# Altium footprint library con-samtec.PCBLIB: 805 footprints (part 44 of 55)
Each footprint in its own frame and in the unit in brackets; x right, y up, seen from the top. Pads: shape width x height; smd on the part's side, far side on the other; paste and mask are expansions set on the pad; w line width, h text height; cw(c..) or ccw(c..) is an arc to the next point about the centre after c.
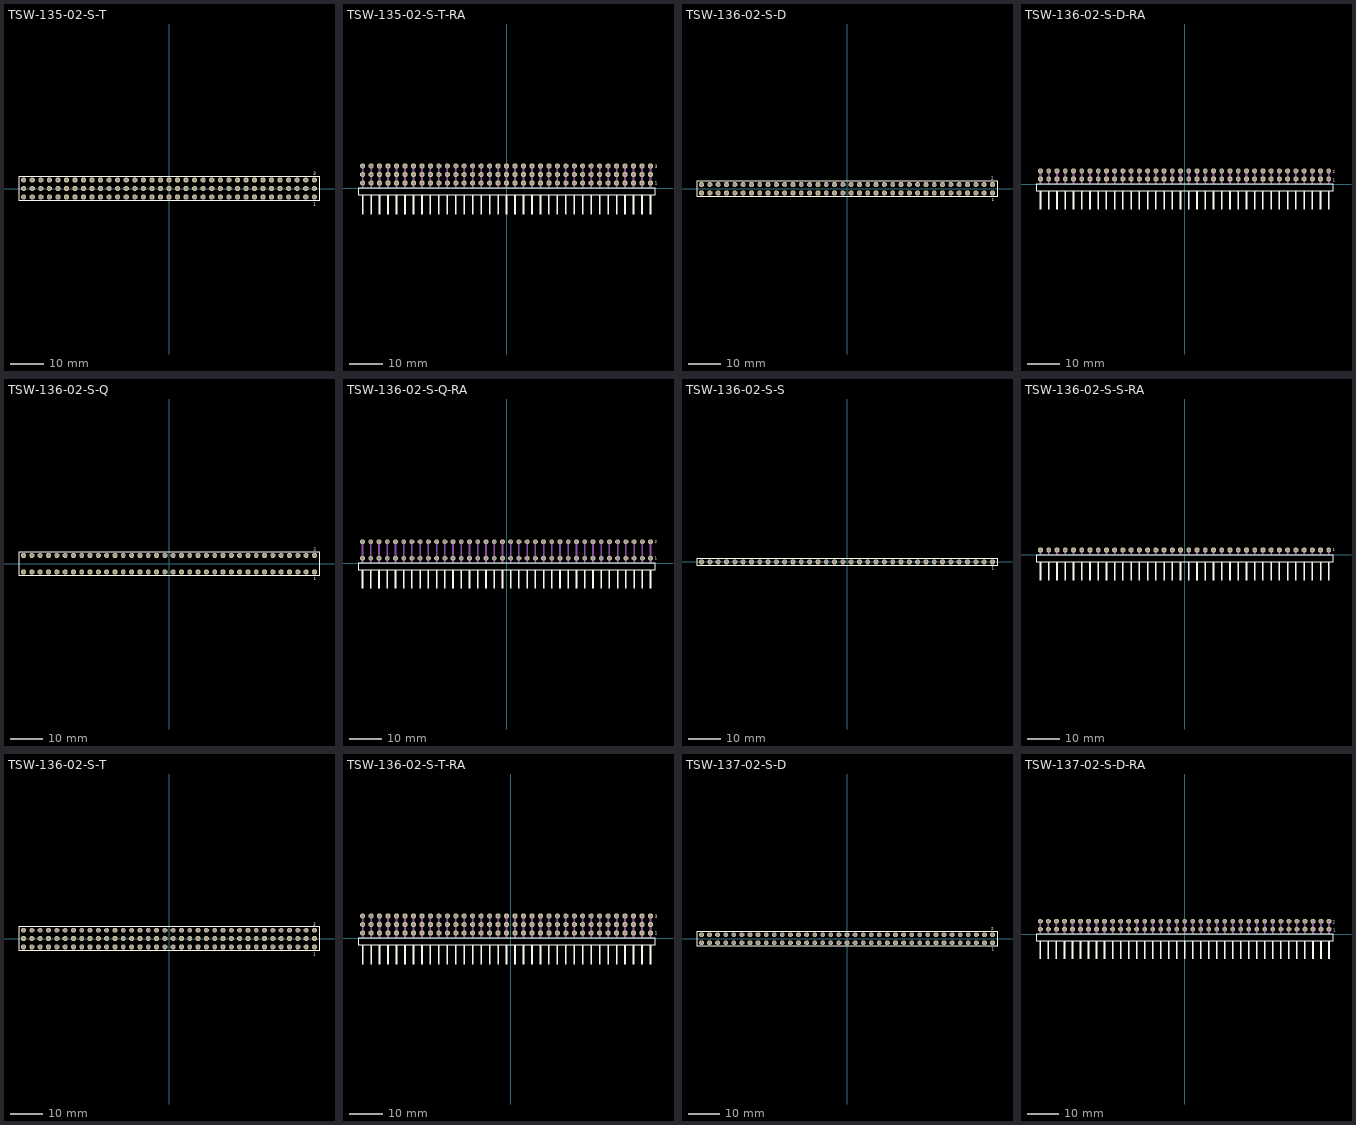
[diagram p43: the footprints below, top view; thin cyan lines are the x and y axes]

## TSW-135-02-S-T [mm]
pads (105):
  oct 1.5x1.5 hole 1: 1(43.18,-2.54) 2(43.18,0) 3(43.18,2.54) 4(40.64,-2.54) 5(40.64,0) 6(40.64,2.54) 7(38.1,-2.54) 8(38.1,0) 9(38.1,2.54) 10(35.56,-2.54) 11(35.56,0) 12(35.56,2.54) 13(33.02,-2.54) 14(33.02,0) 15(33.02,2.54) 16(30.48,-2.54) 17(30.48,0) 18(30.48,2.54) 19(27.94,-2.54) 20(27.94,0) 21(27.94,2.54) 22(25.4,-2.54) 23(25.4,0) 24(25.4,2.54) 25(22.86,-2.54) 26(22.86,0) 27(22.86,2.54) 28(20.32,-2.54) 29(20.32,0) 30(20.32,2.54) 31(17.78,-2.54) 32(17.78,0) 33(17.78,2.54) 34(15.24,-2.54) 35(15.24,0) 36(15.24,2.54) 37(12.7,-2.54) 38(12.7,0) 39(12.7,2.54) 40(10.16,-2.54) 41(10.16,0) 42(10.16,2.54) 43(7.62,-2.54) 44(7.62,0) 45(7.62,2.54) 46(5.08,-2.54) 47(5.08,0) 48(5.08,2.54) 49(2.54,-2.54) 50(2.54,0) 51(2.54,2.54) 52(0,-2.54) 53(0,0) 54(0,2.54) 55(-2.54,-2.54) 56(-2.54,0) 57(-2.54,2.54) 58(-5.08,-2.54) 59(-5.08,0) 60(-5.08,2.54) 61(-7.62,-2.54) 62(-7.62,0) 63(-7.62,2.54) 64(-10.16,-2.54) 65(-10.16,0) 66(-10.16,2.54) 67(-12.7,-2.54) 68(-12.7,0) 69(-12.7,2.54) 70(-15.24,-2.54) 71(-15.24,0) 72(-15.24,2.54) 73(-17.78,-2.54) 74(-17.78,0) 75(-17.78,2.54) 76(-20.32,-2.54) 77(-20.32,0) 78(-20.32,2.54) 79(-22.86,-2.54) 80(-22.86,0) 81(-22.86,2.54) 82(-25.4,-2.54) 83(-25.4,0) 84(-25.4,2.54) 85(-27.94,-2.54) 86(-27.94,0) 87(-27.94,2.54) 88(-30.48,-2.54) 89(-30.48,0) 90(-30.48,2.54) 91(-33.02,-2.54) 92(-33.02,0) 93(-33.02,2.54) 94(-35.56,-2.54) 95(-35.56,0) 96(-35.56,2.54) 97(-38.1,-2.54) 98(-38.1,0) 99(-38.1,2.54) 100(-40.64,-2.54) 101(-40.64,0) 102(-40.64,2.54) 103(-43.18,-2.54) 104(-43.18,0) 105(-43.18,2.54)
Top Overlay:
  lines w0.203: -44.579,-3.695 44.579,-3.695 44.579,3.695 -44.579,3.695 -44.579,-3.695
  text "1" at 42.872,-5.188 h0.94
  text "3" at 42.868,3.989 h0.94
Mechanical 16:
  rectangle: -43.53,-2.89 -42.83,-2.19
  rectangle: -43.53,-0.35 -42.83,0.35
  rectangle: -43.53,2.19 -42.83,2.89
  rectangle: -40.99,-2.89 -40.29,-2.19
  rectangle: -40.99,-0.35 -40.29,0.35
  rectangle: -40.99,2.19 -40.29,2.89
  rectangle: -38.45,-2.89 -37.75,-2.19
  rectangle: -38.45,-0.35 -37.75,0.35
  rectangle: -38.45,2.19 -37.75,2.89
  rectangle: -35.91,-2.89 -35.21,-2.19
  rectangle: -35.91,-0.35 -35.21,0.35
  rectangle: -35.91,2.19 -35.21,2.89
  rectangle: -33.37,-2.89 -32.67,-2.19
  rectangle: -33.37,-0.35 -32.67,0.35
  rectangle: -33.37,2.19 -32.67,2.89
  rectangle: -30.83,-2.89 -30.13,-2.19
  rectangle: -30.83,-0.35 -30.13,0.35
  rectangle: -30.83,2.19 -30.13,2.89
  rectangle: -28.29,-2.89 -27.59,-2.19
  rectangle: -28.29,-0.35 -27.59,0.35
  rectangle: -28.29,2.19 -27.59,2.89
  rectangle: -25.75,-2.89 -25.05,-2.19
  rectangle: -25.75,-0.35 -25.05,0.35
  rectangle: -25.75,2.19 -25.05,2.89
  rectangle: -23.21,-2.89 -22.51,-2.19
  rectangle: -23.21,-0.35 -22.51,0.35
  rectangle: -23.21,2.19 -22.51,2.89
  rectangle: -20.67,-2.89 -19.97,-2.19
  rectangle: -20.67,-0.35 -19.97,0.35
  rectangle: -20.67,2.19 -19.97,2.89
  rectangle: -18.13,-2.89 -17.43,-2.19
  rectangle: -18.13,-0.35 -17.43,0.35
  rectangle: -18.13,2.19 -17.43,2.89
  rectangle: -15.59,-2.89 -14.89,-2.19
  rectangle: -15.59,-0.35 -14.89,0.35
  rectangle: -15.59,2.19 -14.89,2.89
  rectangle: -13.05,-2.89 -12.35,-2.19
  rectangle: -13.05,-0.35 -12.35,0.35
  rectangle: -13.05,2.19 -12.35,2.89
  rectangle: -10.51,-2.89 -9.81,-2.19
  rectangle: -10.51,-0.35 -9.81,0.35
  rectangle: -10.51,2.19 -9.81,2.89
  rectangle: -7.97,-2.89 -7.27,-2.19
  rectangle: -7.97,-0.35 -7.27,0.35
  rectangle: -7.97,2.19 -7.27,2.89
  rectangle: -5.43,-2.89 -4.73,-2.19
  rectangle: -5.43,-0.35 -4.73,0.35
  rectangle: -5.43,2.19 -4.73,2.89
  rectangle: -2.89,-2.89 -2.19,-2.19
  rectangle: -2.89,-0.35 -2.19,0.35
  rectangle: -2.89,2.19 -2.19,2.89
  rectangle: -0.35,-2.89 0.35,-2.19
  rectangle: -0.35,-0.35 0.35,0.35
  rectangle: -0.35,2.19 0.35,2.89
  rectangle: 2.19,-2.89 2.89,-2.19
  rectangle: 2.19,-0.35 2.89,0.35
  rectangle: 2.19,2.19 2.89,2.89
  rectangle: 4.73,-2.89 5.43,-2.19
  rectangle: 4.73,-0.35 5.43,0.35
  rectangle: 4.73,2.19 5.43,2.89
  rectangle: 7.27,-2.89 7.97,-2.19
  rectangle: 7.27,-0.35 7.97,0.35
  rectangle: 7.27,2.19 7.97,2.89
  rectangle: 9.81,-2.89 10.51,-2.19
  rectangle: 9.81,-0.35 10.51,0.35
  rectangle: 9.81,2.19 10.51,2.89
  rectangle: 12.35,-2.89 13.05,-2.19
  rectangle: 12.35,-0.35 13.05,0.35
  rectangle: 12.35,2.19 13.05,2.89
  rectangle: 14.89,-2.89 15.59,-2.19
  rectangle: 14.89,-0.35 15.59,0.35
  rectangle: 14.89,2.19 15.59,2.89
  rectangle: 17.43,-2.89 18.13,-2.19
  rectangle: 17.43,-0.35 18.13,0.35
  rectangle: 17.43,2.19 18.13,2.89
  rectangle: 19.97,-2.89 20.67,-2.19
  rectangle: 19.97,-0.35 20.67,0.35
  rectangle: 19.97,2.19 20.67,2.89
  rectangle: 22.51,-2.89 23.21,-2.19
  rectangle: 22.51,-0.35 23.21,0.35
  rectangle: 22.51,2.19 23.21,2.89
  rectangle: 25.05,-2.89 25.75,-2.19
  rectangle: 25.05,-0.35 25.75,0.35
  rectangle: 25.05,2.19 25.75,2.89
  rectangle: 27.59,-2.89 28.29,-2.19
  rectangle: 27.59,-0.35 28.29,0.35
  rectangle: 27.59,2.19 28.29,2.89
  rectangle: 30.13,-2.89 30.83,-2.19
  rectangle: 30.13,-0.35 30.83,0.35
  rectangle: 30.13,2.19 30.83,2.89
  rectangle: 32.67,-2.89 33.37,-2.19
  rectangle: 32.67,-0.35 33.37,0.35
  rectangle: 32.67,2.19 33.37,2.89
  rectangle: 35.21,-2.89 35.91,-2.19
  rectangle: 35.21,-0.35 35.91,0.35
  rectangle: 35.21,2.19 35.91,2.89
  rectangle: 37.75,-2.89 38.45,-2.19
  rectangle: 37.75,-0.35 38.45,0.35
  rectangle: 37.75,2.19 38.45,2.89
  rectangle: 40.29,-2.89 40.99,-2.19
  rectangle: 40.29,-0.35 40.99,0.35
  rectangle: 40.29,2.19 40.99,2.89
  rectangle: 42.83,-2.89 43.53,-2.19
  rectangle: 42.83,-0.35 43.53,0.35
  rectangle: 42.83,2.19 43.53,2.89

## TSW-135-02-S-T-RA [mil]
pads (105):
  oct 59.06x59.06 hole 39.37: 1(1700,60) 2(1700,160) 3(1700,260) 4(1600,60) 5(1600,160) 6(1600,260) 7(1500,60) 8(1500,160) 9(1500,260) 10(1400,60) 11(1400,160) 12(1400,260) 13(1300,60) 14(1300,160) 15(1300,260) 16(1200,60) 17(1200,160) 18(1200,260) 19(1100,60) 20(1100,160) 21(1100,260) 22(1000,60) 23(1000,160) 24(1000,260) 25(900,60) 26(900,160) 27(900,260) 28(800,60) 29(800,160) 30(800,260) 31(700,60) 32(700,160) 33(700,260) 34(600,60) 35(600,160) 36(600,260) 37(500,60) 38(500,160) 39(500,260) 40(400,60) 41(400,160) 42(400,260) 43(300,60) 44(300,160) 45(300,260) 46(200,60) 47(200,160) 48(200,260) 49(100,60) 50(100,160) 51(100,260) 52(0,60) 53(0,160) 54(0,260) 55(-100,60) 56(-100,160) 57(-100,260) 58(-200,60) 59(-200,160) 60(-200,260) 61(-300,60) 62(-300,160) 63(-300,260) 64(-400,60) 65(-400,160) 66(-400,260) 67(-500,60) 68(-500,160) 69(-500,260) 70(-600,60) 71(-600,160) 72(-600,260) 73(-700,60) 74(-700,160) 75(-700,260) 76(-800,60) 77(-800,160) 78(-800,260) 79(-900,60) 80(-900,160) 81(-900,260) 82(-1000,60) 83(-1000,160) 84(-1000,260) 85(-1100,60) 86(-1100,160) 87(-1100,260) 88(-1200,60) 89(-1200,160) 90(-1200,260) 91(-1300,60) 92(-1300,160) 93(-1300,260) 94(-1400,60) 95(-1400,160) 96(-1400,260) 97(-1500,60) 98(-1500,160) 99(-1500,260) 100(-1600,60) 101(-1600,160) 102(-1600,260) 103(-1700,60) 104(-1700,160) 105(-1700,260)
Top Overlay:
  rectangle: -1710,-310.63 -1690,-80.32
  rectangle: -1610,-310.63 -1590,-80.32
  rectangle: -1510,-310.63 -1490,-80.32
  rectangle: -1410,-310.63 -1390,-80.32
  rectangle: -1310,-310.63 -1290,-80.32
  rectangle: -1210,-310.63 -1190,-80.32
  rectangle: -1110,-310.63 -1090,-80.32
  rectangle: -1010,-310.63 -990,-80.32
  rectangle: -910,-310.63 -890,-80.32
  rectangle: -810,-310.63 -790,-80.32
  rectangle: -710,-310.63 -690,-80.32
  rectangle: -610,-310.63 -590,-80.32
  rectangle: -510,-310.63 -490,-80.32
  rectangle: -410,-310.63 -390,-80.32
  rectangle: -310,-310.63 -290,-80.32
  rectangle: -210,-310.63 -190,-80.32
  rectangle: -110,-310.63 -90,-80.32
  rectangle: -10,-310.63 10,-80.32
  rectangle: 90,-310.63 110,-80.32
  rectangle: 190,-310.63 210,-80.32
  rectangle: 290,-310.63 310,-80.32
  rectangle: 390,-310.63 410,-80.32
  rectangle: 490,-310.63 510,-80.32
  rectangle: 590,-310.63 610,-80.32
  rectangle: 690,-310.63 710,-80.32
  rectangle: 790,-310.63 810,-80.32
  rectangle: 890,-310.63 910,-80.32
  rectangle: 990,-310.63 1010,-80.32
  rectangle: 1090,-310.63 1110,-80.32
  rectangle: 1190,-310.63 1210,-80.32
  rectangle: 1290,-310.63 1310,-80.32
  rectangle: 1390,-310.63 1410,-80.32
  rectangle: 1490,-310.63 1510,-80.32
  rectangle: 1590,-310.63 1610,-80.32
  rectangle: 1690,-310.63 1710,-80.32
  lines w8: -1755.08,-80.55 1755.08,-80.55 1755.08,-4.17 -1755.08,-4.17 -1755.08,-80.55
  text "1" at 1751.57,41.34 h36.81
  text "3" at 1752.17,236.81 h36.81
Mechanical 16:
  rectangle: -1710,0 -1690,270
  rectangle: -1610,0 -1590,270
  rectangle: -1510,0 -1490,270
  rectangle: -1410,0 -1390,270
  rectangle: -1310,0 -1290,270
  rectangle: -1210,0 -1190,270
  rectangle: -1110,0 -1090,270
  rectangle: -1010,0 -990,270
  rectangle: -910,0 -890,270
  rectangle: -810,0 -790,270
  rectangle: -710,0 -690,270
  rectangle: -610,0 -590,270
  rectangle: -510,0 -490,270
  rectangle: -410,0 -390,270
  rectangle: -310,0 -290,270
  rectangle: -210,0 -190,270
  rectangle: -110,0 -90,270
  rectangle: -10,0 10,270
  rectangle: 90,0 110,270
  rectangle: 190,0 210,270
  rectangle: 290,0 310,270
  rectangle: 390,0 410,270
  rectangle: 490,0 510,270
  rectangle: 590,0 610,270
  rectangle: 690,0 710,270
  rectangle: 790,0 810,270
  rectangle: 890,0 910,270
  rectangle: 990,0 1010,270
  rectangle: 1090,0 1110,270
  rectangle: 1190,0 1210,270
  rectangle: 1290,0 1310,270
  rectangle: 1390,0 1410,270
  rectangle: 1490,0 1510,270
  rectangle: 1590,0 1610,270
  rectangle: 1690,0 1710,270

## TSW-136-02-S-D [mm]
pads (72):
  oct 1.5x1.5 hole 1: 1(44.45,-1.27) 2(44.45,1.27) 3(41.91,-1.27) 4(41.91,1.27) 5(39.37,-1.27) 6(39.37,1.27) 7(36.83,-1.27) 8(36.83,1.27) 9(34.29,-1.27) 10(34.29,1.27) 11(31.75,-1.27) 12(31.75,1.27) 13(29.21,-1.27) 14(29.21,1.27) 15(26.67,-1.27) 16(26.67,1.27) 17(24.13,-1.27) 18(24.13,1.27) 19(21.59,-1.27) 20(21.59,1.27) 21(19.05,-1.27) 22(19.05,1.27) 23(16.51,-1.27) 24(16.51,1.27) 25(13.97,-1.27) 26(13.97,1.27) 27(11.43,-1.27) 28(11.43,1.27) 29(8.89,-1.27) 30(8.89,1.27) 31(6.35,-1.27) 32(6.35,1.27) 33(3.81,-1.27) 34(3.81,1.27) 35(1.27,-1.27) 36(1.27,1.27) 37(-1.27,-1.27) 38(-1.27,1.27) 39(-3.81,-1.27) 40(-3.81,1.27) 41(-6.35,-1.27) 42(-6.35,1.27) 43(-8.89,-1.27) 44(-8.89,1.27) 45(-11.43,-1.27) 46(-11.43,1.27) 47(-13.97,-1.27) 48(-13.97,1.27) 49(-16.51,-1.27) 50(-16.51,1.27) 51(-19.05,-1.27) 52(-19.05,1.27) 53(-21.59,-1.27) 54(-21.59,1.27) 55(-24.13,-1.27) 56(-24.13,1.27) 57(-26.67,-1.27) 58(-26.67,1.27) 59(-29.21,-1.27) 60(-29.21,1.27) 61(-31.75,-1.27) 62(-31.75,1.27) 63(-34.29,-1.27) 64(-34.29,1.27) 65(-36.83,-1.27) 66(-36.83,1.27) 67(-39.37,-1.27) 68(-39.37,1.27) 69(-41.91,-1.27) 70(-41.91,1.27) 71(-44.45,-1.27) 72(-44.45,1.27)
Top Overlay:
  lines w0.203: -45.849,-2.425 45.849,-2.425 45.849,2.425 -45.849,2.425 -45.849,-2.425
  text "1" at 44.242,-3.818 h0.94
  text "2" at 44.067,2.744 h0.94
Mechanical 16:
  rectangle: -44.8,-1.62 -44.1,-0.92
  rectangle: -44.8,0.92 -44.1,1.62
  rectangle: -42.26,-1.62 -41.56,-0.92
  rectangle: -42.26,0.92 -41.56,1.62
  rectangle: -39.72,-1.62 -39.02,-0.92
  rectangle: -39.72,0.92 -39.02,1.62
  rectangle: -37.18,-1.62 -36.48,-0.92
  rectangle: -37.18,0.92 -36.48,1.62
  rectangle: -34.64,-1.62 -33.94,-0.92
  rectangle: -34.64,0.92 -33.94,1.62
  rectangle: -32.1,-1.62 -31.4,-0.92
  rectangle: -32.1,0.92 -31.4,1.62
  rectangle: -29.56,-1.62 -28.86,-0.92
  rectangle: -29.56,0.92 -28.86,1.62
  rectangle: -27.02,-1.62 -26.32,-0.92
  rectangle: -27.02,0.92 -26.32,1.62
  rectangle: -24.48,-1.62 -23.78,-0.92
  rectangle: -24.48,0.92 -23.78,1.62
  rectangle: -21.94,-1.62 -21.24,-0.92
  rectangle: -21.94,0.92 -21.24,1.62
  rectangle: -19.4,-1.62 -18.7,-0.92
  rectangle: -19.4,0.92 -18.7,1.62
  rectangle: -16.86,-1.62 -16.16,-0.92
  rectangle: -16.86,0.92 -16.16,1.62
  rectangle: -14.32,-1.62 -13.62,-0.92
  rectangle: -14.32,0.92 -13.62,1.62
  rectangle: -11.78,-1.62 -11.08,-0.92
  rectangle: -11.78,0.92 -11.08,1.62
  rectangle: -9.24,-1.62 -8.54,-0.92
  rectangle: -9.24,0.92 -8.54,1.62
  rectangle: -6.7,-1.62 -6,-0.92
  rectangle: -6.7,0.92 -6,1.62
  rectangle: -4.16,-1.62 -3.46,-0.92
  rectangle: -4.16,0.92 -3.46,1.62
  rectangle: -1.62,-1.62 -0.92,-0.92
  rectangle: -1.62,0.92 -0.92,1.62
  rectangle: 0.92,-1.62 1.62,-0.92
  rectangle: 0.92,0.92 1.62,1.62
  rectangle: 3.46,-1.62 4.16,-0.92
  rectangle: 3.46,0.92 4.16,1.62
  rectangle: 6,-1.62 6.7,-0.92
  rectangle: 6,0.92 6.7,1.62
  rectangle: 8.54,-1.62 9.24,-0.92
  rectangle: 8.54,0.92 9.24,1.62
  rectangle: 11.08,-1.62 11.78,-0.92
  rectangle: 11.08,0.92 11.78,1.62
  rectangle: 13.62,-1.62 14.32,-0.92
  rectangle: 13.62,0.92 14.32,1.62
  rectangle: 16.16,-1.62 16.86,-0.92
  rectangle: 16.16,0.92 16.86,1.62
  rectangle: 18.7,-1.62 19.4,-0.92
  rectangle: 18.7,0.92 19.4,1.62
  rectangle: 21.24,-1.62 21.94,-0.92
  rectangle: 21.24,0.92 21.94,1.62
  rectangle: 23.78,-1.62 24.48,-0.92
  rectangle: 23.78,0.92 24.48,1.62
  rectangle: 26.32,-1.62 27.02,-0.92
  rectangle: 26.32,0.92 27.02,1.62
  rectangle: 28.86,-1.62 29.56,-0.92
  rectangle: 28.86,0.92 29.56,1.62
  rectangle: 31.4,-1.62 32.1,-0.92
  rectangle: 31.4,0.92 32.1,1.62
  rectangle: 33.94,-1.62 34.64,-0.92
  rectangle: 33.94,0.92 34.64,1.62
  rectangle: 36.48,-1.62 37.18,-0.92
  rectangle: 36.48,0.92 37.18,1.62
  rectangle: 39.02,-1.62 39.72,-0.92
  rectangle: 39.02,0.92 39.72,1.62
  rectangle: 41.56,-1.62 42.26,-0.92
  rectangle: 41.56,0.92 42.26,1.62
  rectangle: 44.1,-1.62 44.8,-0.92
  rectangle: 44.1,0.92 44.8,1.62

## TSW-136-02-S-D-RA [mil]
pads (72):
  oct 59.06x59.06 hole 39.37: 1(1750,60) 2(1750,160) 3(1650,60) 4(1650,160) 5(1550,60) 6(1550,160) 7(1450,60) 8(1450,160) 9(1350,60) 10(1350,160) 11(1250,60) 12(1250,160) 13(1150,60) 14(1150,160) 15(1050,60) 16(1050,160) 17(950,60) 18(950,160) 19(850,60) 20(850,160) 21(750,60) 22(750,160) 23(650,60) 24(650,160) 25(550,60) 26(550,160) 27(450,60) 28(450,160) 29(350,60) 30(350,160) 31(250,60) 32(250,160) 33(150,60) 34(150,160) 35(50,60) 36(50,160) 37(-50,60) 38(-50,160) 39(-150,60) 40(-150,160) 41(-250,60) 42(-250,160) 43(-350,60) 44(-350,160) 45(-450,60) 46(-450,160) 47(-550,60) 48(-550,160) 49(-650,60) 50(-650,160) 51(-750,60) 52(-750,160) 53(-850,60) 54(-850,160) 55(-950,60) 56(-950,160) 57(-1050,60) 58(-1050,160) 59(-1150,60) 60(-1150,160) 61(-1250,60) 62(-1250,160) 63(-1350,60) 64(-1350,160) 65(-1450,60) 66(-1450,160) 67(-1550,60) 68(-1550,160) 69(-1650,60) 70(-1650,160) 71(-1750,60) 72(-1750,160)
Top Overlay:
  rectangle: -1760,-310.63 -1740,-80.32
  rectangle: -1660,-310.63 -1640,-80.32
  rectangle: -1560,-310.63 -1540,-80.32
  rectangle: -1460,-310.63 -1440,-80.32
  rectangle: -1360,-310.63 -1340,-80.32
  rectangle: -1260,-310.63 -1240,-80.32
  rectangle: -1160,-310.63 -1140,-80.32
  rectangle: -1060,-310.63 -1040,-80.32
  rectangle: -960,-310.63 -940,-80.32
  rectangle: -860,-310.63 -840,-80.32
  rectangle: -760,-310.63 -740,-80.32
  rectangle: -660,-310.63 -640,-80.32
  rectangle: -560,-310.63 -540,-80.32
  rectangle: -460,-310.63 -440,-80.32
  rectangle: -360,-310.63 -340,-80.32
  rectangle: -260,-310.63 -240,-80.32
  rectangle: -160,-310.63 -140,-80.32
  rectangle: -60,-310.63 -40,-80.32
  rectangle: 40,-310.63 60,-80.32
  rectangle: 140,-310.63 160,-80.32
  rectangle: 240,-310.63 260,-80.32
  rectangle: 340,-310.63 360,-80.32
  rectangle: 440,-310.63 460,-80.32
  rectangle: 540,-310.63 560,-80.32
  rectangle: 640,-310.63 660,-80.32
  rectangle: 740,-310.63 760,-80.32
  rectangle: 840,-310.63 860,-80.32
  rectangle: 940,-310.63 960,-80.32
  rectangle: 1040,-310.63 1060,-80.32
  rectangle: 1140,-310.63 1160,-80.32
  rectangle: 1240,-310.63 1260,-80.32
  rectangle: 1340,-310.63 1360,-80.32
  rectangle: 1440,-310.63 1460,-80.32
  rectangle: 1540,-310.63 1560,-80.32
  rectangle: 1640,-310.63 1660,-80.32
  rectangle: 1740,-310.63 1760,-80.32
  lines w8: -1805.08,-80.55 1805.08,-80.55 1805.08,-4.17 -1805.08,-4.17 -1805.08,-80.55
  text "1" at 1800.59,30.51 h36.81
  text "2" at 1799.21,129.53 h36.81
Mechanical 16:
  rectangle: -1760,0 -1740,170
  rectangle: -1660,0 -1640,170
  rectangle: -1560,0 -1540,170
  rectangle: -1460,0 -1440,170
  rectangle: -1360,0 -1340,170
  rectangle: -1260,0 -1240,170
  rectangle: -1160,0 -1140,170
  rectangle: -1060,0 -1040,170
  rectangle: -960,0 -940,170
  rectangle: -860,0 -840,170
  rectangle: -760,0 -740,170
  rectangle: -660,0 -640,170
  rectangle: -560,0 -540,170
  rectangle: -460,0 -440,170
  rectangle: -360,0 -340,170
  rectangle: -260,0 -240,170
  rectangle: -160,0 -140,170
  rectangle: -60,0 -40,170
  rectangle: 40,0 60,170
  rectangle: 140,0 160,170
  rectangle: 240,0 260,170
  rectangle: 340,0 360,170
  rectangle: 440,0 460,170
  rectangle: 540,0 560,170
  rectangle: 640,0 660,170
  rectangle: 740,0 760,170
  rectangle: 840,0 860,170
  rectangle: 940,0 960,170
  rectangle: 1040,0 1060,170
  rectangle: 1140,0 1160,170
  rectangle: 1240,0 1260,170
  rectangle: 1340,0 1360,170
  rectangle: 1440,0 1460,170
  rectangle: 1540,0 1560,170
  rectangle: 1640,0 1660,170
  rectangle: 1740,0 1760,170

## TSW-136-02-S-Q [mm]
pads (72):
  oct 1.5x1.5 hole 1: 1(44.45,-2.54) 2(44.45,2.54) 3(41.91,-2.54) 4(41.91,2.54) 5(39.37,-2.54) 6(39.37,2.54) 7(36.83,-2.54) 8(36.83,2.54) 9(34.29,-2.54) 10(34.29,2.54) 11(31.75,-2.54) 12(31.75,2.54) 13(29.21,-2.54) 14(29.21,2.54) 15(26.67,-2.54) 16(26.67,2.54) 17(24.13,-2.54) 18(24.13,2.54) 19(21.59,-2.54) 20(21.59,2.54) 21(19.05,-2.54) 22(19.05,2.54) 23(16.51,-2.54) 24(16.51,2.54) 25(13.97,-2.54) 26(13.97,2.54) 27(11.43,-2.54) 28(11.43,2.54) 29(8.89,-2.54) 30(8.89,2.54) 31(6.35,-2.54) 32(6.35,2.54) 33(3.81,-2.54) 34(3.81,2.54) 35(1.27,-2.54) 36(1.27,2.54) 37(-1.27,-2.54) 38(-1.27,2.54) 39(-3.81,-2.54) 40(-3.81,2.54) 41(-6.35,-2.54) 42(-6.35,2.54) 43(-8.89,-2.54) 44(-8.89,2.54) 45(-11.43,-2.54) 46(-11.43,2.54) 47(-13.97,-2.54) 48(-13.97,2.54) 49(-16.51,-2.54) 50(-16.51,2.54) 51(-19.05,-2.54) 52(-19.05,2.54) 53(-21.59,-2.54) 54(-21.59,2.54) 55(-24.13,-2.54) 56(-24.13,2.54) 57(-26.67,-2.54) 58(-26.67,2.54) 59(-29.21,-2.54) 60(-29.21,2.54) 61(-31.75,-2.54) 62(-31.75,2.54) 63(-34.29,-2.54) 64(-34.29,2.54) 65(-36.83,-2.54) 66(-36.83,2.54) 67(-39.37,-2.54) 68(-39.37,2.54) 69(-41.91,-2.54) 70(-41.91,2.54) 71(-44.45,-2.54) 72(-44.45,2.54)
Top Overlay:
  lines w0.203: -45.849,-3.695 45.849,-3.695 45.849,3.695 -45.849,3.695 -45.849,-3.695
  text "1" at 44.292,-5.138 h0.94
  text "2" at 44.192,3.989 h0.94
Mechanical 16:
  rectangle: -44.8,-2.89 -44.1,-2.19
  rectangle: -44.8,2.19 -44.1,2.89
  rectangle: -42.26,-2.89 -41.56,-2.19
  rectangle: -42.26,2.19 -41.56,2.89
  rectangle: -39.72,-2.89 -39.02,-2.19
  rectangle: -39.72,2.19 -39.02,2.89
  rectangle: -37.18,-2.89 -36.48,-2.19
  rectangle: -37.18,2.19 -36.48,2.89
  rectangle: -34.64,-2.89 -33.94,-2.19
  rectangle: -34.64,2.19 -33.94,2.89
  rectangle: -32.1,-2.89 -31.4,-2.19
  rectangle: -32.1,2.19 -31.4,2.89
  rectangle: -29.56,-2.89 -28.86,-2.19
  rectangle: -29.56,2.19 -28.86,2.89
  rectangle: -27.02,-2.89 -26.32,-2.19
  rectangle: -27.02,2.19 -26.32,2.89
  rectangle: -24.48,-2.89 -23.78,-2.19
  rectangle: -24.48,2.19 -23.78,2.89
  rectangle: -21.94,-2.89 -21.24,-2.19
  rectangle: -21.94,2.19 -21.24,2.89
  rectangle: -19.4,-2.89 -18.7,-2.19
  rectangle: -19.4,2.19 -18.7,2.89
  rectangle: -16.86,-2.89 -16.16,-2.19
  rectangle: -16.86,2.19 -16.16,2.89
  rectangle: -14.32,-2.89 -13.62,-2.19
  rectangle: -14.32,2.19 -13.62,2.89
  rectangle: -11.78,-2.89 -11.08,-2.19
  rectangle: -11.78,2.19 -11.08,2.89
  rectangle: -9.24,-2.89 -8.54,-2.19
  rectangle: -9.24,2.19 -8.54,2.89
  rectangle: -6.7,-2.89 -6,-2.19
  rectangle: -6.7,2.19 -6,2.89
  rectangle: -4.16,-2.89 -3.46,-2.19
  rectangle: -4.16,2.19 -3.46,2.89
  rectangle: -1.62,-2.89 -0.92,-2.19
  rectangle: -1.62,2.19 -0.92,2.89
  rectangle: 0.92,-2.89 1.62,-2.19
  rectangle: 0.92,2.19 1.62,2.89
  rectangle: 3.46,-2.89 4.16,-2.19
  rectangle: 3.46,2.19 4.16,2.89
  rectangle: 6,-2.89 6.7,-2.19
  rectangle: 6,2.19 6.7,2.89
  rectangle: 8.54,-2.89 9.24,-2.19
  rectangle: 8.54,2.19 9.24,2.89
  rectangle: 11.08,-2.89 11.78,-2.19
  rectangle: 11.08,2.19 11.78,2.89
  rectangle: 13.62,-2.89 14.32,-2.19
  rectangle: 13.62,2.19 14.32,2.89
  rectangle: 16.16,-2.89 16.86,-2.19
  rectangle: 16.16,2.19 16.86,2.89
  rectangle: 18.7,-2.89 19.4,-2.19
  rectangle: 18.7,2.19 19.4,2.89
  rectangle: 21.24,-2.89 21.94,-2.19
  rectangle: 21.24,2.19 21.94,2.89
  rectangle: 23.78,-2.89 24.48,-2.19
  rectangle: 23.78,2.19 24.48,2.89
  rectangle: 26.32,-2.89 27.02,-2.19
  rectangle: 26.32,2.19 27.02,2.89
  rectangle: 28.86,-2.89 29.56,-2.19
  rectangle: 28.86,2.19 29.56,2.89
  rectangle: 31.4,-2.89 32.1,-2.19
  rectangle: 31.4,2.19 32.1,2.89
  rectangle: 33.94,-2.89 34.64,-2.19
  rectangle: 33.94,2.19 34.64,2.89
  rectangle: 36.48,-2.89 37.18,-2.19
  rectangle: 36.48,2.19 37.18,2.89
  rectangle: 39.02,-2.89 39.72,-2.19
  rectangle: 39.02,2.19 39.72,2.89
  rectangle: 41.56,-2.89 42.26,-2.19
  rectangle: 41.56,2.19 42.26,2.89
  rectangle: 44.1,-2.89 44.8,-2.19
  rectangle: 44.1,2.19 44.8,2.89
